# Altium footprint library THT.PcbLib: 60 footprints (part 4 of 4)
Each footprint in its own frame and in the unit in brackets; x right, y up, seen from the top. Pads: shape width x height; smd on the part's side, far side on the other; paste and mask are expansions set on the pad; w line width, h text height; cw(c..) or ccw(c..) is an arc to the next point about the centre after c.
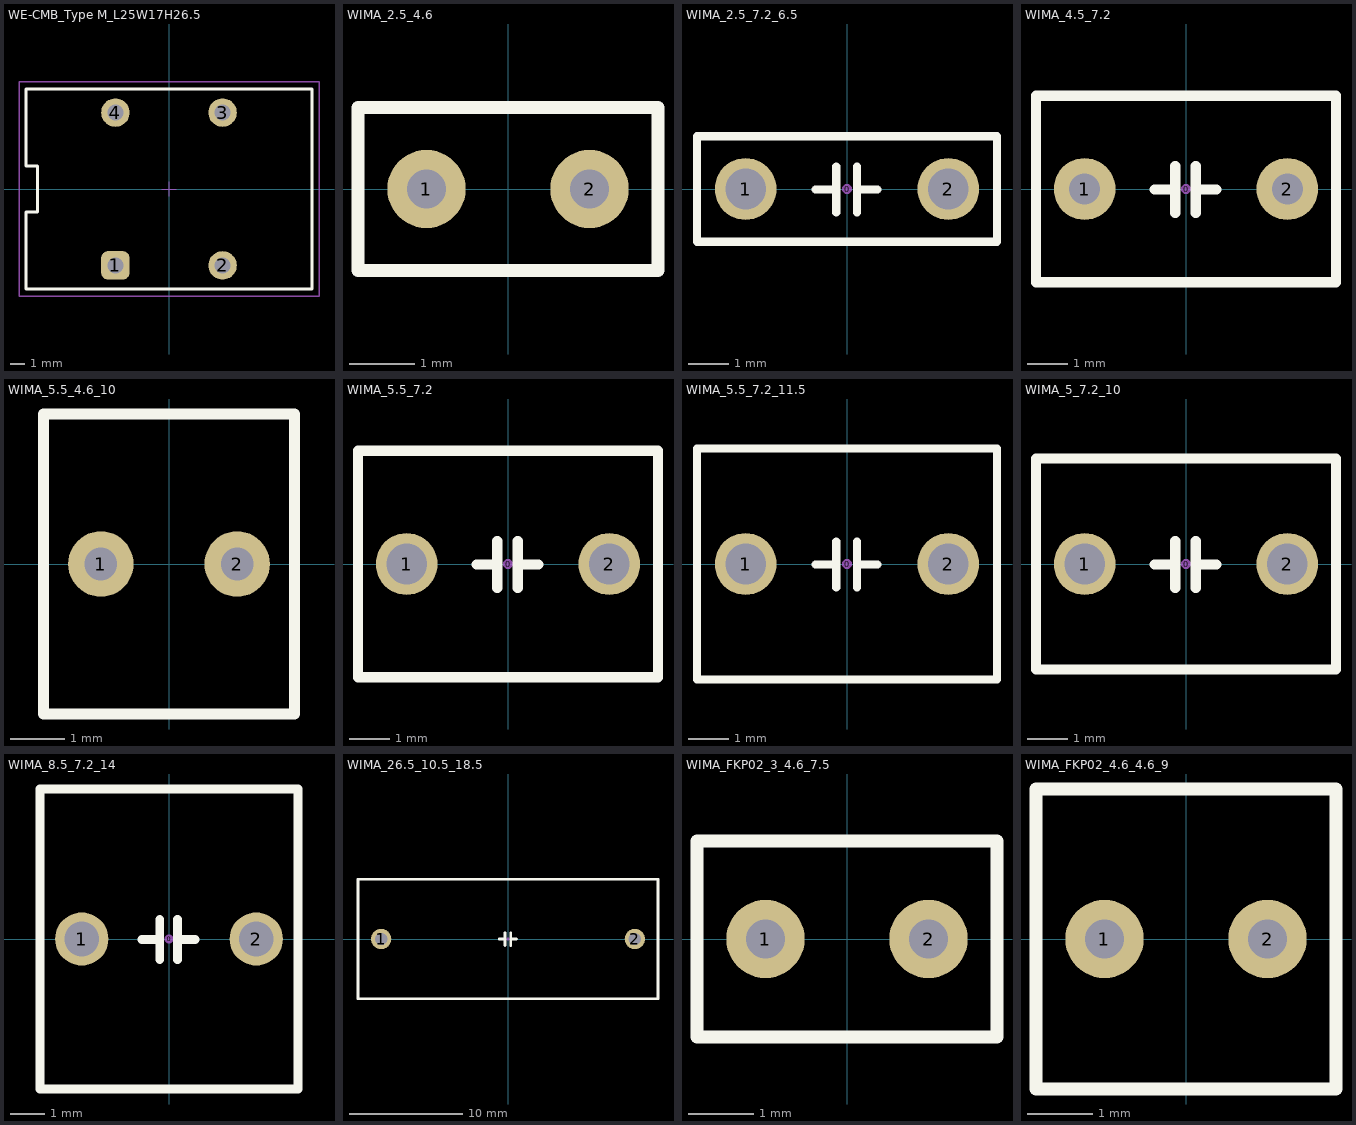
[diagram p3: the footprints below, top view; thin cyan lines are the x and y axes]

## WE-CMB_Type M_L25W17H26.5 [mm] "Common Mode Power Line Choke, 4-Leads, body 25x17mm"
height 26.5
pads (4):
  rrect50% 2x2 / inner rrect50% 3x3 / far side rrect50% 3x3 hole 1.1: 1(-3.75,-5.35)
  round 2 / inner round 3 / far side round 3 hole 1.1: 2(3.75,-5.35) 3(3.75,5.35) 4(-3.75,5.35)
Top Overlay:
  lines w0.2: -10,-7 -10,-1.6 -9.2,-1.6 -9.2,1.6 -10,1.6 -10,4.1 -10,7 10,7 10,-7 -10,-7
Mechanical 15:
  lines w0.05: -0.5,0 0.5,0 ; 0,-0.5 0,0.5
  lines w0.1: -10.5,-7.5 -10.5,7.5 10.5,7.5 10.5,-7.5 -10.5,-7.5
3D body "744823601_M.stp": height 23.37, standoff -2.9, extent -9.941,-7.03 9.941,7.027

## WIMA_2.5_4.6 [mm]
height 2.38
pads (2):
  round 1.2 / inner round 1.2 / far side oval 1.6x2.1 hole 0.6: 1(-1.25,0) 2(1.25,0)
Top Overlay:
  lines w0.2: -2.3,-1.25 -2.3,1.25 2.3,1.25 2.3,-1.25 -2.3,-1.25
3D body "wima_2.5x4.6.STEP": height 6.95, standoff -2.55, extent -2.3,-1.25 2.3,1.25

## WIMA_2.5_7.2_6.5 [mil]
height 93.7
pads (3):
  round 10 on Mech15: 0(0,0)
  round 60 / inner round 60 / far side round 86.61 hole 39.37: 1(-98.43,0) 2(98.43,0)
Top Overlay:
  lines w7.87: -30.43,-0.5 -10.43,-0.5 ; -10.43,-23 -10.43,22 ; 9.57,-23 9.57,22 ; 9.57,-0.5 29.57,-0.5 ; -145.67,-51.18 145.67,-51.18 145.67,51.18 -145.67,51.18 -145.67,-51.18
3D body "WIMA_25_72_65.STEP": height 246.06, standoff -108.27, extent -141.73,-49.21 141.73,49.21

## WIMA_4.5_7.2 [mil]
pads (3):
  round 10 on Mech15: 0(0,0)
  round 60 / inner round 60 / far side round 86.61 hole 30: 1(-98.43,0) 2(98.43,0)
Top Overlay:
  lines w10: -30.43,-0.5 -10.43,-0.5 ; -10.43,-23 -10.43,22 ; 9.57,-23 9.57,22 ; 9.57,-0.5 29.57,-0.5 ; 145.67,-90.55 -145.67,-90.55 -145.67,90.55 145.67,90.55 ; 145.67,-90.55 145.67,90.55 ; 145.67,-90.55 145.67,90.55
3D body "User Library-FKP2 1nF-100 FKP2D011001D00.SLDPRT": height 236.22, standoff -157.48, extent -140.15,-88.58 143.31,88.98

## WIMA_5.5_4.6_10 [mm]
height 2.38
pads (2):
  round 1.2 / inner round 1.2 / far side oval 1.6x2.1 hole 0.6: 1(-1.25,0) 2(1.25,0)
Top Overlay:
  lines w0.2: -2.3,-2.75 -2.3,2.75 2.3,2.75 2.3,-2.75 -2.3,-2.75
3D body "User Library-CAPRR250W40L460T550H1000_WIMA_0F.STEP": height 9.95, standoff -2.55, extent -2.3,-2.75 2.3,2.75

## WIMA_5.5_7.2 [mil]
height 93.7
pads (3):
  round 10 on Mech15: 0(0,0)
  round 60 / inner round 60 / far side round 86.61 hole 39.37: 1(-98.43,0) 2(98.43,0)
Top Overlay:
  lines w10: -30.43,-0.5 -10.43,-0.5 ; -10.43,-23 -10.43,22 ; 9.57,-23 9.57,22 ; 9.57,-0.5 29.57,-0.5 ; 145.67,-90.55 145.67,110 -145.67,110 -145.67,-110 145.67,-110 145.67,90.55
3D body "wima5.5x7.2.STEP": height 275.59, standoff -118.11, extent -143.43,-110 140.04,106.53

## WIMA_5.5_7.2_11.5 [mil]
height 93.7
pads (3):
  round 10 on Mech15: 0(0,0)
  round 60 / inner round 60 / far side round 86.61 hole 39.37: 1(-98.43,0) 2(98.43,0)
Top Overlay:
  lines w7.87: -30.43,-0.5 -10.43,-0.5 ; -10.43,-23 -10.43,22 ; 9.57,-23 9.57,22 ; 9.57,-0.5 29.57,-0.5 ; 145.67,-90.55 145.67,112.2 -145.67,112.2 -145.67,-112.2 145.67,-112.2 145.67,90.55
3D body "wima_55_72_115.STEP": height 442.91, standoff -108.27, extent -141.73,-108.27 141.73,108.27

## WIMA_5_7.2_10 [mil]
height 93.7
pads (3):
  round 10 on Mech15: 0(0,0)
  round 60 / inner round 60 / far side round 86.61 hole 39.37: 1(-98.43,0) 2(98.43,0)
Top Overlay:
  lines w10: -30.43,-0.5 -10.43,-0.5 ; -10.43,-23 -10.43,22 ; 9.57,-23 9.57,22 ; 9.57,-0.5 29.57,-0.5 ; 145.67,-90.55 145.67,102.36 -145.67,102.36 -145.67,-102.36 145.67,-102.36 145.67,90.55
3D body "wima_50_72_100.STEP": height 395.67, standoff -96.46, extent -141.73,-98.43 141.73,98.43

## WIMA_8.5_7.2_14 [mil]
height 93.7
pads (3):
  round 10 on Mech15: 0(0,0)
  round 60 / inner round 60 / far side round 86.61 hole 39.37: 1(-98.43,0) 2(98.43,0)
Top Overlay:
  lines w10: -30.43,-0.5 -10.43,-0.5 ; -10.43,-23 -10.43,22 ; 9.57,-23 9.57,22 ; 9.57,-0.5 29.57,-0.5 ; 145.67,-90.55 145.67,169.29 -145.67,169.29 -145.67,-169.29 145.67,-169.29 145.67,90.55
3D body "User Library-CAPRR500W50L720T850H1000_WIMA_1L.STEP": height 395.67, standoff -96.46, extent -141.73,-167.32 141.74,167.33

## WIMA_26.5_10.5_18.5 [mm]
height 2.38
pads (3):
  round 0.254 on Mech15: 0(0,0)
  round 1.8 / inner round 1.8 / far side round 3 hole 1.1: 1(-11.25,0) 2(11.25,0)
Top Overlay:
  lines w0.254: -0.773,-0.013 -0.265,-0.013 ; -0.265,-0.584 -0.265,0.559 ; 0.243,-0.584 0.243,0.559 ; 0.243,-0.013 0.751,-0.013 ; 13.3,-2.3 13.3,5.3 -13.3,5.3 -13.3,-5.3 13.3,-5.3 13.3,2.3
3D body "User Library-FILM_GREY_P2250L2650W1050H1850PD80.step": height 18.8, standoff -4.7, extent -13.25,-5.25 13.25,5.25

## WIMA_FKP02_3_4.6_7.5 [mm]
height 2.38
pads (2):
  round 1.2 / inner round 1.2 / far side oval 1.6x2.1 hole 0.6: 1(-1.25,0) 2(1.25,0)
Top Overlay:
  lines w0.2: -2.3,-1.5 2.3,-1.5 2.3,1.5 -2.3,1.5 -2.3,-1.5
3D body "User Library-CAPRR250W40L460T300H750_WIMA_0C.STEP": height 7.45, standoff -2.55, extent -2.3,-1.5 2.3,1.5

## WIMA_FKP02_4.6_4.6_9 [mm]
height 2.38
pads (2):
  round 1.2 / inner round 1.2 / far side oval 1.6x2.1 hole 0.6: 1(-1.25,0) 2(1.25,0)
Top Overlay:
  lines w0.2: -2.3,-2.3 2.3,-2.3 2.3,2.3 -2.3,2.3 -2.3,-2.3
3D body "User Library-CAPRR250W40L460T460H900_WIMA_0E.STEP": height 8.95, standoff -2.55, extent -2.3,-2.3 2.3,2.3